# Altium footprint library Transformers.PcbLib: 80 footprints (part 5 of 6)
Each footprint in its own frame and in the unit in brackets; x right, y up, seen from the top. Pads: shape width x height; smd on the part's side, far side on the other; paste and mask are expansions set on the pad; w line width, h text height; cw(c..) or ccw(c..) is an arc to the next point about the centre after c.
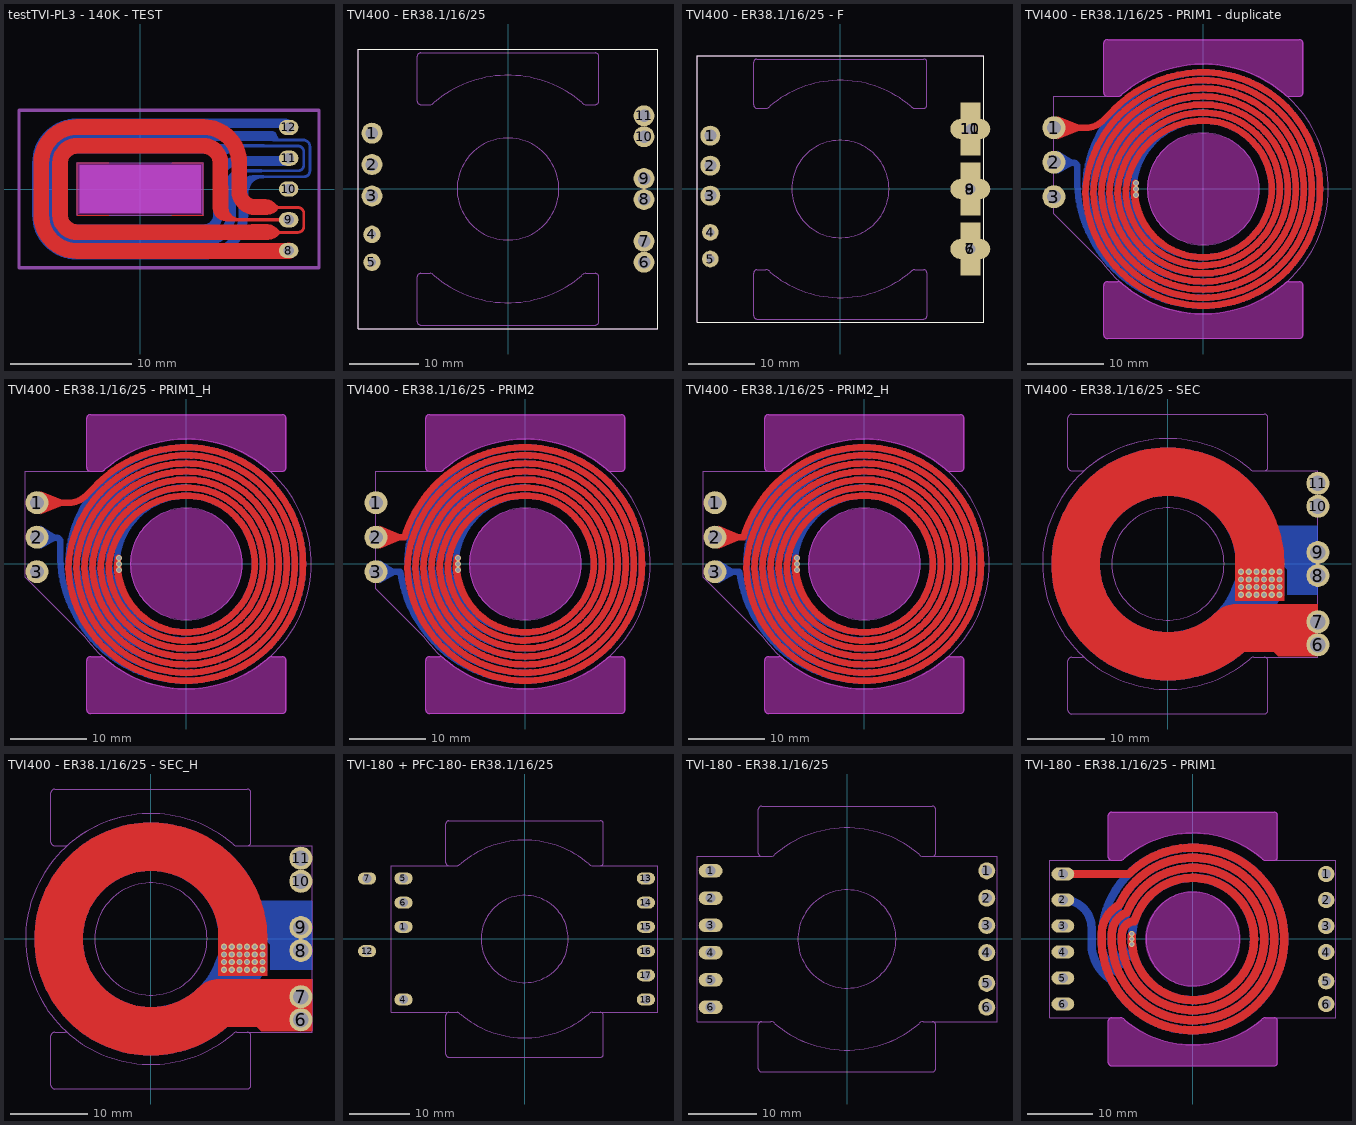
[diagram p4: the footprints below, top view; thin cyan lines are the x and y axes]

## testTVI-PL3 - 140K - TEST [mm]
pads (5):
  oval 1.6x1.25 hole 0.85: 8(12.25,-5.08) 9(12.25,-2.54) 10(12.25,0) 11(12.25,2.54) 12(12.25,5.08)
Top Layer:
  region: 5.975,0.25 5.975,-1.456 5.975,-1.576 6.022,-1.811 6.114,-2.033 6.247,-2.233 6.417,-2.403 6.617,-2.536 6.839,-2.628 7.074,-2.675 7.194,-2.675 8.2,-2.675 8.195,-2.675 8.186,-2.671 8.179,-2.664 8.175,-2.655 8.175,-2.65 8.175,-2.4 8.084,-2.396 7.906,-2.36 7.739,-2.291 7.588,-2.19 7.46,-2.062 7.359,-1.911 7.29,-1.744 7.254,-1.566 7.25,-1.475 7.25,0.275
  region: 11.533,-3.663 11.356,-3.84 11.272,-3.925 11.072,-4.058 10.85,-4.15 10.614,-4.197 10.494,-4.197 9.145,-4.197 9.145,-3.613
  region: 9.144,-2.921 10.442,-2.921 10.562,-2.921 10.798,-2.968 11.02,-3.06 11.22,-3.193 11.304,-3.278 11.506,-3.48 11.512,-3.486 11.522,-3.5 11.528,-3.516 11.532,-3.533 11.532,-3.541 11.532,-3.683 9.267,-3.683 9.25,-3.683 9.216,-3.676 9.184,-3.663 9.156,-3.644 9.144,-3.632
  region: 9.4,-0.843 10.295,-0.843 10.415,-0.843 10.651,-0.889 10.872,-0.981 11.072,-1.115 11.157,-1.2 11.4,-1.443 11.4,-1.643 11.257,-1.786 11.172,-1.87 10.972,-2.004 10.751,-2.096 10.515,-2.143 10.395,-2.143 9.4,-2.143
  lines w0.1: -2.6,-2.15 -5.2,-2.15 -5.2,2.15 -2.6,2.15 ; 2.6,-2.15 5.2,-2.15 5.2,2.15 2.6,2.15
  lines w0.229: 9.755,-3.581 13.005,-3.581 ccw(c13.005,-3.086) 13.5,-3.086 13.5,-2.019 ccw(c13.005,-2.019) 13.005,-1.524 9.755,-1.524
  lines w0.254: 6.612,0 ccw(c6.612,-0.012) 6.6,-0.012 6.6,-1.1 ccw(c8.04,-1.1) 8.04,-2.54 12.25,-2.54
  lines w1.3: 5,-5.116 12.214,-5.116 ccw(c12.214,-5.08) 12.25,-5.08 ; 5.2,-5.116 -5.2,-5.116 cw(c-5.2,-2.15) -8.166,-2.15 -8.166,2.15 cw(c-5.2,2.15) -5.2,5.116 5.2,5.116 cw(c5.2,2.15) 8.166,2.15 8.166,-0.166 ccw(c9.5,-0.166) 9.5,-1.5 ; 6.612,0 6.612,2.15 ccw(c5.2,2.15) 5.2,3.562 -5.2,3.562 ccw(c-5.2,2.15) -6.612,2.15 -6.612,-2.15 ccw(c-5.2,-2.15) -5.2,-3.562 5.2,-3.562 9.735,-3.562
  text "1" at 5.5,1.5 h0.5
Bottom Layer:
  region: 10.2,1.125 9.344,1.125 9.224,1.125 8.989,1.078 8.767,0.986 8.567,0.853 8.397,0.683 8.264,0.483 8.172,0.261 8.125,0.026 8.125,-0.094 8.125,-2.1 8.925,-2.1 8.925,-0.319 8.931,-0.2 8.977,0.035 9.069,0.256 9.202,0.454 9.371,0.623 9.569,0.756 9.79,0.848 10.025,0.894 10.144,0.9 10.2,0.9
  region: 10.025,1.625 8.294,1.625 8.174,1.625 7.939,1.578 7.717,1.486 7.517,1.353 7.347,1.183 7.214,0.983 7.122,0.761 7.075,0.526 7.075,0.406 7.075,-2.275 7.875,-2.275 7.875,0.181 7.879,0.285 7.915,0.49 7.985,0.686 8.087,0.868 8.218,1.029 8.376,1.166 8.554,1.274 8.747,1.35 8.849,1.375 10.025,1.375
  region: 11.435,3.932 12.256,3.932 13.461,3.932 13.461,4.155 12.2,4.155 11.8,4.155 11.43,4.155 11.388,4.221 11.111,4.661 10.874,4.013 10.93,3.932
  region: 8.36,3.429 8.275,3.425 8.108,3.392 7.951,3.327 7.81,3.232 7.747,3.175 7.687,3.115 7.545,3.02 7.387,2.954 7.219,2.921 7.134,2.921 6.223,2.921 6.223,3.647 6.223,3.656 6.219,3.672 6.213,3.688 6.203,3.702 6.198,3.708 9.968,3.708 10.062,3.708 10.246,3.672 10.42,3.6 10.576,3.495 10.643,3.429
  lines w0.1: -2.6,-2.15 -5.2,-2.15 -5.2,2.15 -2.6,2.15 ; 2.6,-2.15 5.2,-2.15 5.2,2.15 2.6,2.15
  lines w0.229: 8.52,-2.15 8.52,-0.244 cw(c9.755,-0.244) 9.755,0.991 ; 9.755,1.016 13.005,1.016 13.516,1.016 ccw(c13.516,1.5) 14,1.5 14,3.5 ccw(c13.461,3.5) 13.461,4.039 12.5,4.039 ; 9.755,1.499 13.005,1.499 ccw(c13.005,1.994) 13.5,1.994 13.5,3.061 ccw(c13.005,3.061) 13.005,3.556 9.755,3.556
  lines w0.8: 6.198,3.312 -5.25,3.312 ccw(c-5.25,2.15) -6.412,2.15 -6.412,-2.15 ccw(c-5.25,-2.15) -5.25,-3.312 5.25,-3.312 ccw(c5.25,-2.15) 6.412,-2.15 6.412,0 6.412,0.595 cw(c8.128,0.595) 8.128,2.311 12.021,2.311 ccw(c12.021,2.54) 12.25,2.54 ; 7.466,-2.15 cw(c5.25,-2.15) 5.25,-4.366 -5.25,-4.366 cw(c-5.25,-2.15) -7.466,-2.15 -7.466,2.15 cw(c-5.25,2.15) -5.25,4.366 5.25,4.366 10.897,4.366 ; 8.52,-2.15 cw(c5.25,-2.15) 5.25,-5.42 -5.25,-5.42 cw(c-5.25,-2.15) -8.52,-2.15 -8.52,2.15 cw(c-5.25,2.15) -5.25,5.42 5.25,5.42 11.91,5.42 cw(c11.91,5.08) 12.25,5.08
  text "2" at 5.7,-1.7 h0.5
Keep-Out Layer:
  board cut-out: -5.15,2.1 -5.15,-2.1 5.15,-2.1 5.15,2.1
Mechanical 1:
  lines w0.254: -10,-6.5 14.75,-6.5 14.75,6.5 -5.5,6.5 -10,6.5 -10,-6.5
Mechanical 2:
  lines w0.1: -5.2,-2.15 -5.2,2.15 2.6,2.15 5.2,2.15 5.2,-2.15 2.6,-2.15 -5.2,-2.15
Mechanical 13:
  rectangle: -5,-2 5,2
3D body: height 4, standoff -4, extent -5,-1.9 5,2

## TVI400 - ER38.1/16/25 [mm]
pads (11):
  round 3 hole 1.8: 1(-19.5,8) 2(-19.5,3.5) 3(-19.5,-1) 6(19.5,-10.5) 7(19.5,-7.5) 8(19.5,-1.5) 9(19.5,1.5) 10(19.5,7.5) 11(19.5,10.5)
  round 2.5 hole 1.2: 4(-19.5,-6.5) 5(-19.5,-10.5)
Top Overlay:
  lines w0.15: -21.5,-20 -21.5,20 21.5,20 21.5,-20 -21.5,-20
Mechanical 13:
  circle w0.15: c0,0 r7.3
  lines w0.15: -0.251,16.298 cw(c0,0) 10.561,12.416 10.678,12.299 ccw(c11.15,12.771) 11.15,12.103 12.5,12.103 ccw(c12.5,12.603) 13,12.603 13,19 ccw(c12.5,19) 12.5,19.5 -12.5,19.5 ccw(c-12.5,19) -13,19 -13,12.603 ccw(c-12.5,12.603) -12.5,12.103 -11.15,12.103 ccw(c-11.15,12.771) -10.679,12.299 -10.562,12.416 cw(c0,0) 0.251,16.298 ; -13,-19 ccw(c-12.5,-19) -12.5,-19.5 ; -13,-19 ccw(c-12.5,-19) -12.5,-19.5 ; -13,-19 -13,-12.603 ; -13,-19 -13,-12.603 ; -13,-12.603 cw(c-12.5,-12.603) -12.5,-12.103 ; -13,-12.603 cw(c-12.5,-12.603) -12.5,-12.103 ; -12.5,-19.5 12.5,-19.5 ; -12.5,-19.5 12.5,-19.5 ; -12.5,-12.103 -11.15,-12.103 ; -12.5,-12.103 -11.15,-12.103 ; -11.15,-12.103 cw(c-11.15,-12.771) -10.679,-12.299 ; -11.15,-12.103 cw(c-11.15,-12.771) -10.679,-12.299 ; -10.679,-12.299 -10.562,-12.416 ; -10.679,-12.299 -10.562,-12.416 ; -10.561,-12.416 ccw(c0,0) 0.251,-16.298 cw(c0,0) -10.561,-12.416 ; 10.561,-12.416 cw(c0,0) -0.251,-16.298 ccw(c0,0) 10.561,-12.416 ; 10.561,-12.416 10.678,-12.299 ; 10.561,-12.416 10.678,-12.299 ; 10.678,-12.299 cw(c11.15,-12.771) 11.15,-12.103 ; 10.678,-12.299 cw(c11.15,-12.771) 11.15,-12.103 ; 11.15,-12.103 12.5,-12.103 ; 11.15,-12.103 12.5,-12.103 ; 12.5,-19.5 ccw(c12.5,-19) 13,-19 ; 12.5,-19.5 ccw(c12.5,-19) 13,-19 ; 12.5,-12.103 cw(c12.5,-12.603) 13,-12.603 ; 12.5,-12.103 cw(c12.5,-12.603) 13,-12.603 ; 13,-19 13,-12.603 ; 13,-19 13,-12.603 ; -21.5,-20 21.5,-20 21.5,20 -21.5,20 -21.5,-20
3D body "ER38.1-16-25.STEP": height 20, standoff 12, extent -12.7,-19.05 12.7,19.05
3D body "ER38.1-16-25.STEP": height 12, standoff 4, extent -12.7,-19.05 12.7,19.05

## TVI400 - ER38.1/16/25 - F [mm]
pads (11):
  round 3 hole 1.8: 1(-19.5,8) 2(-19.5,3.5) 3(-19.5,-1)
  round 2.5 hole 1.2: 4(-19.5,-6.5) 5(-19.5,-10.5)
  rect 3x8 hole 1.5 square: 6(19.5,-9) 8(19.5,0) 10(19.5,9)
  oval 6x3 all layers, no hole: 7(19.5,-9) 9(19.5,0) 11(19.5,9)
Top Overlay:
  lines w0.15: -21.5,-20 21.5,-20 21.5,20 -21.5,20 -21.5,-20
Mechanical 13:
  circle w0.15: c0,0 r7.3
  lines w0.15: -0.251,16.298 cw(c0,0) 10.561,12.416 10.678,12.299 ccw(c11.15,12.771) 11.15,12.103 12.5,12.103 ccw(c12.5,12.603) 13,12.603 13,19 ccw(c12.5,19) 12.5,19.5 -12.5,19.5 ccw(c-12.5,19) -13,19 -13,12.603 ccw(c-12.5,12.603) -12.5,12.103 -11.15,12.103 ccw(c-11.15,12.771) -10.679,12.299 -10.562,12.416 cw(c0,0) 0.251,16.298 ; -13,-19 ccw(c-12.5,-19) -12.5,-19.5 ; -13,-19 ccw(c-12.5,-19) -12.5,-19.5 ; -13,-19 -13,-12.603 ; -13,-19 -13,-12.603 ; -13,-12.603 cw(c-12.5,-12.603) -12.5,-12.103 ; -13,-12.603 cw(c-12.5,-12.603) -12.5,-12.103 ; -12.5,-19.5 12.5,-19.5 ; -12.5,-19.5 12.5,-19.5 ; -12.5,-12.103 -11.15,-12.103 ; -12.5,-12.103 -11.15,-12.103 ; -11.15,-12.103 cw(c-11.15,-12.771) -10.679,-12.299 ; -11.15,-12.103 cw(c-11.15,-12.771) -10.679,-12.299 ; -10.679,-12.299 -10.562,-12.416 ; -10.679,-12.299 -10.562,-12.416 ; -10.561,-12.416 ccw(c0,0) 0.251,-16.298 cw(c0,0) -10.561,-12.416 ; 10.561,-12.416 cw(c0,0) -0.251,-16.298 ccw(c0,0) 10.561,-12.416 ; 10.561,-12.416 10.678,-12.299 ; 10.561,-12.416 10.678,-12.299 ; 10.678,-12.299 cw(c11.15,-12.771) 11.15,-12.103 ; 10.678,-12.299 cw(c11.15,-12.771) 11.15,-12.103 ; 11.15,-12.103 12.5,-12.103 ; 11.15,-12.103 12.5,-12.103 ; 12.5,-19.5 ccw(c12.5,-19) 13,-19 ; 12.5,-19.5 ccw(c12.5,-19) 13,-19 ; 12.5,-12.103 cw(c12.5,-12.603) 13,-12.603 ; 12.5,-12.103 cw(c12.5,-12.603) 13,-12.603 ; 13,-19 13,-12.603 ; 13,-19 13,-12.603 ; -21.5,-20 -21.5,20 21.5,20 21.5,-20 -21.5,-20
3D body "ER38.1-16-25.STEP": height 12, standoff 4, extent -12.7,-19.05 12.7,19.05
3D body "ER38.1-16-25.STEP": height 20, standoff 12, extent -12.7,-19.05 12.7,19.05

## TVI400 - ER38.1/16/25 - PRIM1 - duplicate [mm]
pads (3):
  round 3 hole 1.8: 1(-19.5,8) 2(-19.5,3.5) 3(-19.5,-1)
via -8.8,0.8 diameter 0.8 hole 0.5
via -8.8,-0.8 diameter 0.8 hole 0.5
via -8.8,0 diameter 0.8 hole 0.5
Top Layer:
  region: -19,9.5 -15.25,8 -19,6.5
  lines w0.85: -19,8 -15.307,8 ccw(c-15.307,11.066) -13.139,8.898 -12.019,10.018 cw(c0,-1.25) 0,15.225 ; -10.152,-0.503 ccw(c0,0.175) 0,-10 cw(c0,0.175) -10.153,-0.494 ; -10.148,-0.507 cw(c0,-1.25) 0,8.925 ; -10.147,-0.497 cw(c0,-1.25) 0,8.925 ; -9.085,-0.401 cw(c0,-1.25) -8.892,0.798 ; -9.075,-0.498 ccw(c0,0.175) 0,-8.925 ; -8.911,-0.495 ccw(c0,0) 0,-8.925 ; 0,-15.225 cw(c0,0.2) -15.409,-0.496 ccw(c0,0.2) 0,-15.225 ; 0,-15.225 ccw(c0,0) 15.225,0 ; 0,-15.225 ccw(c0,0) 15.225,0 ; 0,-14.175 cw(c0,0.2) -14.358,-0.505 ccw(c0,0.2) 0,-14.175 ; 0,-14.175 ccw(c0,0) 14.175,0 ; 0,-14.175 ccw(c0,0) 14.175,0 ; 0,-13.125 cw(c0,0.2) -13.306,-0.503 ccw(c0,0.2) 0,-13.125 ; 0,-13.125 ccw(c0,0) 13.125,0 ; 0,-13.125 ccw(c0,0) 13.125,0 ; 0,-12.075 cw(c0,0.2) -12.255,-0.5 ccw(c0,0.2) 0,-12.075 ; 0,-12.075 ccw(c0,0) 12.075,0 ; 0,-12.075 ccw(c0,0) 12.075,0 ; 0,-11.025 cw(c0,0.2) -11.203,-0.497 ccw(c0,0.2) 0,-11.025 ; 0,-11.025 ccw(c0,0) 11.025,0 ; 0,-11.025 ccw(c0,0) 11.025,0 ; 0,-8.925 ccw(c0,0) 8.925,0 ; 0,-8.925 ccw(c0,0) 8.925,0 ; 0,8.925 cw(c0,0) 8.925,0 ; 0,8.925 cw(c0,0) 8.925,0 ; 0,9.975 ccw(c0,-1.25) -11.2,-0.503 cw(c0,-1.25) 0,9.975 ; 0,9.975 cw(c0,0) 9.975,0 ; 0,9.975 cw(c0,0) 9.975,0 ; 0,11.025 ccw(c0,-1.25) -12.252,-0.5 cw(c0,-1.25) 0,11.025 ; 0,11.025 cw(c0,0) 11.025,0 ; 0,11.025 cw(c0,0) 11.025,0 ; 0,12.075 ccw(c0,-1.25) -13.304,-0.497 cw(c0,-1.25) 0,12.075 ; 0,12.075 cw(c0,0) 12.075,0 ; 0,12.075 cw(c0,0) 12.075,0 ; 0,13.125 ccw(c0,-1.25) -14.355,-0.494 cw(c0,-1.25) 0,13.125 ; 0,13.125 cw(c0,0) 13.125,0 ; 0,13.125 cw(c0,0) 13.125,0 ; 0,14.175 ccw(c0,-1.25) -15.407,-0.505 cw(c0,-1.25) 0,14.175 ; 0,14.175 cw(c0,0) 14.175,0 ; 0,14.175 cw(c0,0) 14.175,0 ; 0,15.225 cw(c0,0) 15.225,0 ; 0,15.225 cw(c0,0) 15.225,0 ; 9.975,0 cw(c0,0) 0,-9.975 ccw(c0,0) 9.975,0
Bottom Layer:
  region: -19,5 -16.473,3.441 -19,2
  region: -9.3,0.4
  lines w0.85: -15.409,0.496 cw(c0,-0.2) 0,15.225 cw(c0,0) 15.225,0 cw(c0,0) 0,-15.225 cw(c0,1.25) -16.458,0.505 -16.458,2.899 ccw(c-17,2.899) -17,3.441 -18.941,3.441 ; -15.407,0.505 ccw(c0,1.25) 0,-14.175 ccw(c0,0) 14.175,0 ccw(c0,0) 0,14.175 ccw(c0,-0.2) -14.358,0.505 ; -14.355,0.494 ccw(c0,1.25) 0,-13.125 ccw(c0,0) 13.125,0 ccw(c0,0) 0,13.125 ccw(c0,-0.2) -13.306,0.503 ; -13.304,0.497 ccw(c0,1.25) 0,-12.075 ccw(c0,0) 12.075,0 ccw(c0,0) 0,12.075 ccw(c0,-0.2) -12.255,0.5 ; -12.252,0.5 ccw(c0,1.25) 0,-11.025 ccw(c0,0) 11.025,0 ccw(c0,0) 0,11.025 ccw(c0,-0.2) -11.203,0.497 ; -11.2,0.503 ccw(c0,1.25) 0,-9.975 ccw(c0,0) 9.975,0 ccw(c0,0) 0,9.975 ; -10.152,0.503 cw(c0,-0.175) 0,10 ; -10.147,0.497 ccw(c0,1.25) 0,-8.925 ccw(c0,0) 8.925,0 ccw(c0,0) 0,8.925 ccw(c0,-0.175) -9.075,0.498 ; -9.085,0.401 ccw(c0,1.25) -8.892,-0.798 ; -18.941,3.441 cw(c-18.941,3.5) -19,3.5 ccw(c-18.941,3.5) -18.941,3.441
Keep-Out Layer:
  drawing of 3 lines, arcs and shapes, not listed
Mechanical 2:
  circle w0.15: c0,0 r7.3
  lines w0.15: -19.5,-3 -19.5,-3.238 ; -0.251,-16.298 ccw(c0,0) 10.561,-12.416 ccw(c0,0) -0.251,16.298 ; 0.251,-16.298 cw(c0,0) -13.264,-9.474 -19.5,-3.238 ; 0.251,16.298 ccw(c0,0) -10.562,12.415 -10.679,12.299 cw(c-11.15,12.771) -11.15,12.103 -12.501,12.103 -19.5,12.103 -19.5,-0.5 -19.5,-3.238
Mechanical 13:
  circle w0.15: c0,0 r7.3
  lines w0.15: -0.251,16.298 cw(c0,0) 10.561,12.416 10.678,12.299 ccw(c11.15,12.771) 11.15,12.103 12.5,12.103 ccw(c12.5,12.603) 13,12.603 13,19 ccw(c12.5,19) 12.5,19.5 -12.5,19.5 ccw(c-12.5,19) -13,19 -13,12.603 ccw(c-12.5,12.603) -12.5,12.103 -11.15,12.103 ccw(c-11.15,12.771) -10.679,12.299 -10.562,12.416 cw(c0,0) 0.251,16.298 ; -13,-19 ccw(c-12.5,-19) -12.5,-19.5 ; -13,-19 ccw(c-12.5,-19) -12.5,-19.5 ; -13,-19 -13,-12.603 ; -13,-19 -13,-12.603 ; -13,-12.603 cw(c-12.5,-12.603) -12.5,-12.103 ; -13,-12.603 cw(c-12.5,-12.603) -12.5,-12.103 ; -12.5,-19.5 12.5,-19.5 ; -12.5,-19.5 12.5,-19.5 ; -12.5,-12.103 -11.15,-12.103 ; -12.5,-12.103 -11.15,-12.103 ; -11.15,-12.103 cw(c-11.15,-12.771) -10.679,-12.299 ; -11.15,-12.103 cw(c-11.15,-12.771) -10.679,-12.299 ; -10.679,-12.299 -10.562,-12.416 ; -10.679,-12.299 -10.562,-12.416 ; -10.561,-12.416 ccw(c0,0) 0.251,-16.298 cw(c0,0) -10.561,-12.416 ; 10.561,-12.416 cw(c0,0) -0.251,-16.298 ccw(c0,0) 10.561,-12.416 ; 10.561,-12.416 10.678,-12.299 ; 10.561,-12.416 10.678,-12.299 ; 10.678,-12.299 cw(c11.15,-12.771) 11.15,-12.103 ; 10.678,-12.299 cw(c11.15,-12.771) 11.15,-12.103 ; 11.15,-12.103 12.5,-12.103 ; 11.15,-12.103 12.5,-12.103 ; 12.5,-19.5 ccw(c12.5,-19) 13,-19 ; 12.5,-19.5 ccw(c12.5,-19) 13,-19 ; 12.5,-12.103 cw(c12.5,-12.603) 13,-12.603 ; 12.5,-12.103 cw(c12.5,-12.603) 13,-12.603 ; 13,-19 13,-12.603 ; 13,-19 13,-12.603
3D body "ER38.1-16-25.STEP": height 7.5, standoff -0.5, extent -12.7,-19.05 12.7,19.05

## TVI400 - ER38.1/16/25 - PRIM1_H [mm]
pads (3):
  round 3 hole 1.8: 1(-19.5,8) 2(-19.5,3.5) 3(-19.5,-1)
via -8.8,0.8 diameter 0.8 hole 0.5
via -8.8,-0.8 diameter 0.8 hole 0.5
via -8.8,0 diameter 0.8 hole 0.5
Top Layer:
  region: -19,9.5 -15.25,8 -19,6.5
  lines w0.85: -19,8 -15.307,8 ccw(c-15.307,11.066) -13.139,8.898 -12.019,10.018 cw(c0,-1.25) 0,15.225 ; -10.152,-0.503 ccw(c0,0.175) 0,-10 cw(c0,0.175) -10.153,-0.494 ; -10.148,-0.507 cw(c0,-1.25) 0,8.925 ; -10.147,-0.497 cw(c0,-1.25) 0,8.925 ; -9.085,-0.401 cw(c0,-1.25) -8.892,0.798 ; -9.075,-0.498 ccw(c0,0.175) 0,-8.925 ; -8.911,-0.495 ccw(c0,0) 0,-8.925 ; 0,-15.225 cw(c0,0.2) -15.409,-0.496 ccw(c0,0.2) 0,-15.225 ; 0,-15.225 ccw(c0,0) 15.225,0 ; 0,-15.225 ccw(c0,0) 15.225,0 ; 0,-14.175 cw(c0,0.2) -14.358,-0.505 ccw(c0,0.2) 0,-14.175 ; 0,-14.175 ccw(c0,0) 14.175,0 ; 0,-14.175 ccw(c0,0) 14.175,0 ; 0,-13.125 cw(c0,0.2) -13.306,-0.503 ccw(c0,0.2) 0,-13.125 ; 0,-13.125 ccw(c0,0) 13.125,0 ; 0,-13.125 ccw(c0,0) 13.125,0 ; 0,-12.075 cw(c0,0.2) -12.255,-0.5 ccw(c0,0.2) 0,-12.075 ; 0,-12.075 ccw(c0,0) 12.075,0 ; 0,-12.075 ccw(c0,0) 12.075,0 ; 0,-11.025 cw(c0,0.2) -11.203,-0.497 ccw(c0,0.2) 0,-11.025 ; 0,-11.025 ccw(c0,0) 11.025,0 ; 0,-11.025 ccw(c0,0) 11.025,0 ; 0,-8.925 ccw(c0,0) 8.925,0 ; 0,-8.925 ccw(c0,0) 8.925,0 ; 0,8.925 cw(c0,0) 8.925,0 ; 0,8.925 cw(c0,0) 8.925,0 ; 0,9.975 ccw(c0,-1.25) -11.2,-0.503 cw(c0,-1.25) 0,9.975 ; 0,9.975 cw(c0,0) 9.975,0 ; 0,9.975 cw(c0,0) 9.975,0 ; 0,11.025 ccw(c0,-1.25) -12.252,-0.5 cw(c0,-1.25) 0,11.025 ; 0,11.025 cw(c0,0) 11.025,0 ; 0,11.025 cw(c0,0) 11.025,0 ; 0,12.075 ccw(c0,-1.25) -13.304,-0.497 cw(c0,-1.25) 0,12.075 ; 0,12.075 cw(c0,0) 12.075,0 ; 0,12.075 cw(c0,0) 12.075,0 ; 0,13.125 ccw(c0,-1.25) -14.355,-0.494 cw(c0,-1.25) 0,13.125 ; 0,13.125 cw(c0,0) 13.125,0 ; 0,13.125 cw(c0,0) 13.125,0 ; 0,14.175 ccw(c0,-1.25) -15.407,-0.505 cw(c0,-1.25) 0,14.175 ; 0,14.175 cw(c0,0) 14.175,0 ; 0,14.175 cw(c0,0) 14.175,0 ; 0,15.225 cw(c0,0) 15.225,0 ; 0,15.225 cw(c0,0) 15.225,0 ; 9.975,0 cw(c0,0) 0,-9.975 ccw(c0,0) 9.975,0
Bottom Layer:
  region: -19,5 -16.473,3.441 -19,2
  region: -9.3,0.4
  lines w0.85: -15.409,0.496 cw(c0,-0.2) 0,15.225 cw(c0,0) 15.225,0 cw(c0,0) 0,-15.225 cw(c0,1.25) -16.458,0.505 -16.458,2.899 ccw(c-17,2.899) -17,3.441 -18.941,3.441 ; -15.407,0.505 ccw(c0,1.25) 0,-14.175 ccw(c0,0) 14.175,0 ccw(c0,0) 0,14.175 ccw(c0,-0.2) -14.358,0.505 ; -14.355,0.494 ccw(c0,1.25) 0,-13.125 ccw(c0,0) 13.125,0 ccw(c0,0) 0,13.125 ccw(c0,-0.2) -13.306,0.503 ; -13.304,0.497 ccw(c0,1.25) 0,-12.075 ccw(c0,0) 12.075,0 ccw(c0,0) 0,12.075 ccw(c0,-0.2) -12.255,0.5 ; -12.252,0.5 ccw(c0,1.25) 0,-11.025 ccw(c0,0) 11.025,0 ccw(c0,0) 0,11.025 ccw(c0,-0.2) -11.203,0.497 ; -11.2,0.503 ccw(c0,1.25) 0,-9.975 ccw(c0,0) 9.975,0 ccw(c0,0) 0,9.975 ; -10.152,0.503 cw(c0,-0.175) 0,10 ; -10.147,0.497 ccw(c0,1.25) 0,-8.925 ccw(c0,0) 8.925,0 ccw(c0,0) 0,8.925 ccw(c0,-0.175) -9.075,0.498 ; -9.085,0.401 ccw(c0,1.25) -8.892,-0.798 ; -18.941,3.441 cw(c-18.941,3.5) -19,3.5 ccw(c-18.941,3.5) -18.941,3.441
Keep-Out Layer:
  drawing of 3 lines, arcs and shapes, not listed
Mechanical 2:
  circle w0.15: c0,0 r7.3
  lines w0.15: -0.251,-16.298 ccw(c0,0) 10.561,-12.416 ccw(c0,0) -0.251,16.298 ; 0.251,-16.298 cw(c0,0) -13.264,-9.474 -19.5,-3.238 -21,-1.738 -21,1 -21,12.103 -12.501,12.103 -11.15,12.103 ccw(c-11.15,12.771) -10.679,12.299 -10.562,12.416 cw(c0,0) 0.251,16.298
Mechanical 13:
  circle w0.15: c0,0 r7.3
  lines w0.15: -0.251,16.298 cw(c0,0) 10.561,12.416 10.678,12.299 ccw(c11.15,12.771) 11.15,12.103 12.5,12.103 ccw(c12.5,12.603) 13,12.603 13,19 ccw(c12.5,19) 12.5,19.5 -12.5,19.5 ccw(c-12.5,19) -13,19 -13,12.603 ccw(c-12.5,12.603) -12.5,12.103 -11.15,12.103 ccw(c-11.15,12.771) -10.679,12.299 -10.562,12.416 cw(c0,0) 0.251,16.298 ; -13,-19 ccw(c-12.5,-19) -12.5,-19.5 ; -13,-19 ccw(c-12.5,-19) -12.5,-19.5 ; -13,-19 -13,-12.603 ; -13,-19 -13,-12.603 ; -13,-12.603 cw(c-12.5,-12.603) -12.5,-12.103 ; -13,-12.603 cw(c-12.5,-12.603) -12.5,-12.103 ; -12.5,-19.5 12.5,-19.5 ; -12.5,-19.5 12.5,-19.5 ; -12.5,-12.103 -11.15,-12.103 ; -12.5,-12.103 -11.15,-12.103 ; -11.15,-12.103 cw(c-11.15,-12.771) -10.679,-12.299 ; -11.15,-12.103 cw(c-11.15,-12.771) -10.679,-12.299 ; -10.679,-12.299 -10.562,-12.416 ; -10.679,-12.299 -10.562,-12.416 ; -10.561,-12.416 ccw(c0,0) 0.251,-16.298 cw(c0,0) -10.561,-12.416 ; 10.561,-12.416 cw(c0,0) -0.251,-16.298 ccw(c0,0) 10.561,-12.416 ; 10.561,-12.416 10.678,-12.299 ; 10.561,-12.416 10.678,-12.299 ; 10.678,-12.299 cw(c11.15,-12.771) 11.15,-12.103 ; 10.678,-12.299 cw(c11.15,-12.771) 11.15,-12.103 ; 11.15,-12.103 12.5,-12.103 ; 11.15,-12.103 12.5,-12.103 ; 12.5,-19.5 ccw(c12.5,-19) 13,-19 ; 12.5,-19.5 ccw(c12.5,-19) 13,-19 ; 12.5,-12.103 cw(c12.5,-12.603) 13,-12.603 ; 12.5,-12.103 cw(c12.5,-12.603) 13,-12.603 ; 13,-19 13,-12.603 ; 13,-19 13,-12.603
3D body "ER38.1-16-25.STEP": height 7.5, standoff -0.5, extent -12.7,-19.05 12.7,19.05

## TVI400 - ER38.1/16/25 - PRIM2 [mm]
pads (3):
  round 3 hole 1.8: 1(-19.5,8) 2(-19.5,3.5) 3(-19.5,-1)
via -8.8,0 diameter 0.8 hole 0.5
via -8.8,-0.8 diameter 0.8 hole 0.5
via -8.8,0.8 diameter 0.8 hole 0.5
Top Layer:
  region: -19,5 -15.5,3.5 -19,2
  lines w0.85: -19.5,3.5 -15.789,3.5 -15.769,3.52 cw(c0,-1.25) 0,15.225 ; -10.152,-0.503 ccw(c0,0.175) 0,-10 cw(c0,0.175) -10.153,-0.494 ; -10.148,-0.507 cw(c0,-1.25) 0,8.925 ; -10.147,-0.497 cw(c0,-1.25) 0,8.925 ; -9.085,-0.401 cw(c0,-1.25) -8.892,0.798 ; -9.075,-0.498 ccw(c0,0.175) 0,-8.925 ; -8.911,-0.495 ccw(c0,0) 0,-8.925 ; 0,-15.225 ccw(c0,0) 15.225,0 ; 0,-15.225 cw(c0,0.2) -15.409,-0.496 ccw(c0,0.2) 0,-15.225 ; 0,-15.225 ccw(c0,0) 15.225,0 ; 0,-14.175 ccw(c0,0) 14.175,0 ; 0,-14.175 cw(c0,0.2) -14.358,-0.505 ccw(c0,0.2) 0,-14.175 ; 0,-14.175 ccw(c0,0) 14.175,0 ; 0,-13.125 ccw(c0,0) 13.125,0 ; 0,-13.125 cw(c0,0.2) -13.306,-0.503 ccw(c0,0.2) 0,-13.125 ; 0,-13.125 ccw(c0,0) 13.125,0 ; 0,-12.075 ccw(c0,0) 12.075,0 ; 0,-12.075 cw(c0,0.2) -12.255,-0.5 ccw(c0,0.2) 0,-12.075 ; 0,-12.075 ccw(c0,0) 12.075,0 ; 0,-11.025 ccw(c0,0) 11.025,0 ; 0,-11.025 cw(c0,0.2) -11.203,-0.497 ccw(c0,0.2) 0,-11.025 ; 0,-11.025 ccw(c0,0) 11.025,0 ; 0,-8.925 ccw(c0,0) 8.925,0 ; 0,-8.925 ccw(c0,0) 8.925,0 ; 0,8.925 cw(c0,0) 8.925,0 ; 0,8.925 cw(c0,0) 8.925,0 ; 0,9.975 cw(c0,0) 9.975,0 ; 0,9.975 ccw(c0,-1.25) -11.2,-0.503 cw(c0,-1.25) 0,9.975 ; 0,9.975 cw(c0,0) 9.975,0 ; 0,11.025 cw(c0,0) 11.025,0 ; 0,11.025 ccw(c0,-1.25) -12.252,-0.5 cw(c0,-1.25) 0,11.025 ; 0,11.025 cw(c0,0) 11.025,0 ; 0,12.075 cw(c0,0) 12.075,0 ; 0,12.075 ccw(c0,-1.25) -13.304,-0.497 cw(c0,-1.25) 0,12.075 ; 0,12.075 cw(c0,0) 12.075,0 ; 0,13.125 cw(c0,0) 13.125,0 ; 0,13.125 ccw(c0,-1.25) -14.355,-0.494 cw(c0,-1.25) 0,13.125 ; 0,13.125 cw(c0,0) 13.125,0 ; 0,14.175 cw(c0,0) 14.175,0 ; 0,14.175 ccw(c0,-1.25) -15.407,-0.505 cw(c0,-1.25) 0,14.175 ; 0,14.175 cw(c0,0) 14.175,0 ; 0,15.225 cw(c0,0) 15.225,0 ; 0,15.225 cw(c0,0) 15.225,0 ; 9.975,0 cw(c0,0) 0,-9.975 ccw(c0,0) 9.975,0
Bottom Layer:
  region: -19,0.5 -16.473,-1.059 -19,-2.5
  region: -9.3,0.4
  lines w0.85: -19.5,-1 -16.32,-1 ; -16.32,-1.001 ccw(c0,1.25) 0,-15.225 ccw(c0,0) 15.225,0 ccw(c0,0) 0,15.225 ccw(c0,-0.2) -15.409,0.496 ; -15.407,0.505 ccw(c0,1.25) 0,-14.175 ccw(c0,0) 14.175,0 ccw(c0,0) 0,14.175 ccw(c0,-0.2) -14.358,0.505 ; -14.355,0.494 ccw(c0,1.25) 0,-13.125 ccw(c0,0) 13.125,0 ccw(c0,0) 0,13.125 ccw(c0,-0.2) -13.306,0.503 ; -13.304,0.497 ccw(c0,1.25) 0,-12.075 ccw(c0,0) 12.075,0 ccw(c0,0) 0,12.075 ccw(c0,-0.2) -12.255,0.5 ; -12.252,0.5 ccw(c0,1.25) 0,-11.025 ccw(c0,0) 11.025,0 ccw(c0,0) 0,11.025 ccw(c0,-0.2) -11.203,0.497 ; -11.2,0.503 ccw(c0,1.25) 0,-9.975 ccw(c0,0) 9.975,0 ccw(c0,0) 0,9.975 ; -10.152,0.503 cw(c0,-0.175) 0,10 ; -10.147,0.497 ccw(c0,1.25) 0,-8.925 ccw(c0,0) 8.925,0 ccw(c0,0) 0,8.925 ccw(c0,-0.175) -9.075,0.498 ; -9.085,0.401 ccw(c0,1.25) -8.892,-0.798 ; -19,3.5 ccw(c-18.941,3.5) -18.941,3.441 cw(c-18.941,3.5) -19,3.5
Keep-Out Layer:
  drawing of 3 lines, arcs and shapes, not listed
Mechanical 2:
  circle w0.15: c0,0 r7.3
  lines w0.15: -19.5,-3 -19.5,-3.238 ; -0.251,-16.298 ccw(c0,0) 10.561,-12.416 ccw(c0,0) -0.251,16.298 ; 0.251,-16.298 cw(c0,0) -13.264,-9.474 -19.5,-3.238 ; 0.251,16.298 ccw(c0,0) -10.562,12.415 -10.679,12.299 cw(c-11.15,12.771) -11.15,12.103 -12.501,12.103 -19.5,12.103 -19.5,-0.5 -19.5,-3.238